# Altium schematic symbol library jlcpcb_2025_04_capacitors_extended_0603.schlib: 3668 symbols (part 10 of 20)
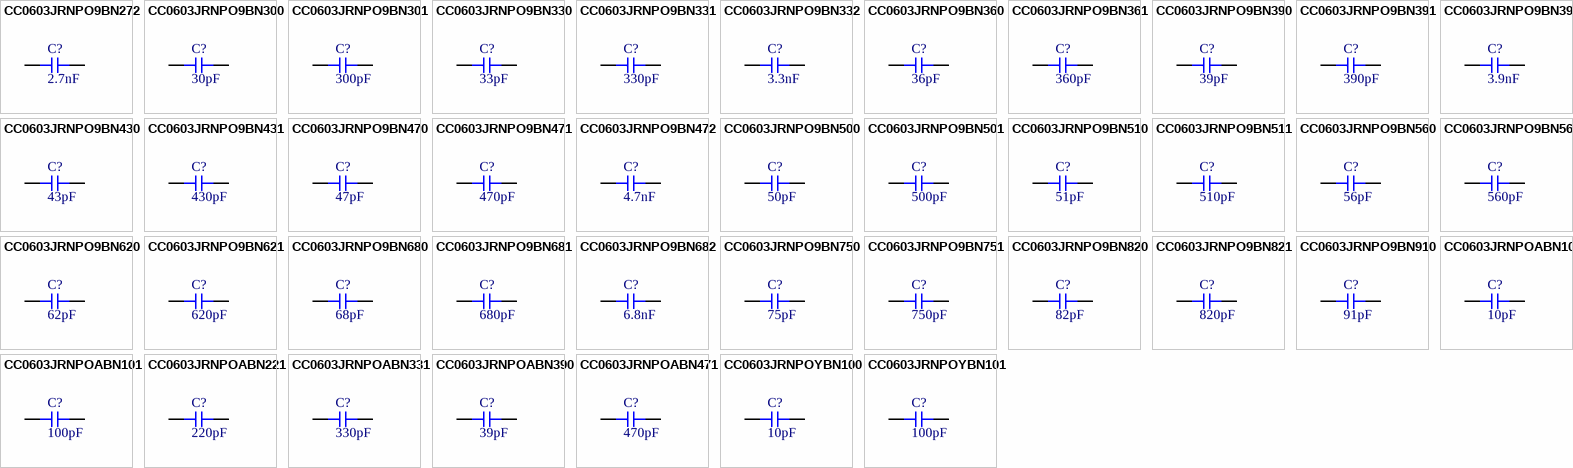
[diagram p100: symbols CC0603JRNPO9BN272 to CC0603JRNPOYBN101]

## CC0603JRNPOABN221
designator C?  Capacitance: 220pF  (hidden comment: *)
Capacitor, Ceramic (MLCC), 220pF, ±5%, 200V, NP0, ±5%, SMD 0603; Manufacturer: YAGEO; Manufacturer Part Number: CC0603JRNPOABN221; Package Size: 0603; JLCPCB Basic Part: No; JLCPCB Part Number: C576822; Supplier 1: LCSC; Category: Capacitors - MLCC; Supplier Part Number 1: C576822; Tolerance: ±5%; Voltage Rating: 200V; Temperature Coefficient: NP0; RoHS: Yes; ComponentLink1Description: Datasheet; ComponentLink1URL: https://wmsc.lcsc.com/wmsc/upload/file/pdf/v2/lcsc/2311211121_YAGEO-CC0603JRNPOABN221_C576822.pdf; ComponentLink2Description: JLCPCB Part URL; ComponentLink2URL: https://jlcpcb.com/partdetail/C576822; ComponentLink3Description: LCSC Part URL; ComponentLink3URL: https://lcsc.com/product-detail/Multilayer-Ceramic-Capacitors-MLCC---SMD-SMT_YAGEO-YAGEO-CC0603JRNPOABN221_C576822.html
footprint CAP-0603 (0603 (1608M) Capacitor)
pins: 1, 2

## CC0603JRNPOABN331
designator C?  Capacitance: 330pF  (hidden comment: *)
Capacitor, Ceramic (MLCC), 330pF, ±5%, 200V, NP0, ±5%, SMD 0603; Manufacturer: YAGEO; Manufacturer Part Number: CC0603JRNPOABN331; Package Size: 0603; JLCPCB Basic Part: No; JLCPCB Part Number: C576823; Supplier 1: LCSC; Category: Capacitors - MLCC; Supplier Part Number 1: C576823; Tolerance: ±5%; Voltage Rating: 200V; Temperature Coefficient: NP0; RoHS: Yes; ComponentLink1Description: Datasheet; ComponentLink1URL: https://wmsc.lcsc.com/wmsc/upload/file/pdf/v2/lcsc/2311211121_YAGEO-CC0603JRNPOABN331_C576823.pdf; ComponentLink2Description: JLCPCB Part URL; ComponentLink2URL: https://jlcpcb.com/partdetail/C576823; ComponentLink3Description: LCSC Part URL; ComponentLink3URL: https://lcsc.com/product-detail/Multilayer-Ceramic-Capacitors-MLCC---SMD-SMT_YAGEO-YAGEO-CC0603JRNPOABN331_C576823.html
footprint CAP-0603 (0603 (1608M) Capacitor)
pins: 1, 2

## CC0603JRNPOABN390
designator C?  Capacitance: 39pF  (hidden comment: *)
Capacitor, Ceramic (MLCC), 39pF, ±5%, 200V, NP0, ±5%, SMD 0603; Manufacturer: YAGEO; Manufacturer Part Number: CC0603JRNPOABN390; Package Size: 0603; JLCPCB Basic Part: No; JLCPCB Part Number: C2193767; Supplier 1: LCSC; Category: Capacitors - MLCC; Supplier Part Number 1: C2193767; Tolerance: ±5%; Voltage Rating: 200V; Temperature Coefficient: NP0; RoHS: Yes; ComponentLink1Description: Datasheet; ComponentLink1URL: https://wmsc.lcsc.com/wmsc/upload/file/pdf/v2/lcsc/2304140030_YAGEO-CC0603JRNPOABN390_C2193767.pdf; ComponentLink2Description: JLCPCB Part URL; ComponentLink2URL: https://jlcpcb.com/partdetail/C2193767; ComponentLink3Description: LCSC Part URL; ComponentLink3URL: https://lcsc.com/product-detail/Multilayer-Ceramic-Capacitors-MLCC---SMD-SMT_YAGEO-YAGEO-CC0603JRNPOABN390_C2193767.html
footprint CAP-0603 (0603 (1608M) Capacitor)
pins: 1, 2

## CC0603JRNPOABN471
designator C?  Capacitance: 470pF  (hidden comment: *)
Capacitor, Ceramic (MLCC), 470pF, ±5%, 200V, NP0, ±5%, SMD 0603; Manufacturer: YAGEO; Manufacturer Part Number: CC0603JRNPOABN471; Package Size: 0603; JLCPCB Basic Part: No; JLCPCB Part Number: C527068; Supplier 1: LCSC; Category: Capacitors - MLCC; Supplier Part Number 1: C527068; Tolerance: ±5%; Voltage Rating: 200V; Temperature Coefficient: NP0; RoHS: Yes; ComponentLink1Description: Datasheet; ComponentLink1URL: https://wmsc.lcsc.com/wmsc/upload/file/pdf/v2/lcsc/2007021836_YAGEO-CC0603JRNPOABN471_C527068.pdf; ComponentLink2Description: JLCPCB Part URL; ComponentLink2URL: https://jlcpcb.com/partdetail/C527068; ComponentLink3Description: LCSC Part URL; ComponentLink3URL: https://lcsc.com/product-detail/Multilayer-Ceramic-Capacitors-MLCC---SMD-SMT_YAGEO-YAGEO-CC0603JRNPOABN471_C527068.html
footprint CAP-0603 (0603 (1608M) Capacitor)
pins: 1, 2

## CC0603JRNPOYBN100
designator C?  Capacitance: 10pF  (hidden comment: *)
Capacitor, Ceramic (MLCC), 10pF, ±5%, 250V, NP0, ±5%, SMD 0603; Manufacturer: YAGEO; Manufacturer Part Number: CC0603JRNPOYBN100; Package Size: 0603; JLCPCB Basic Part: No; JLCPCB Part Number: C726617; Supplier 1: LCSC; Category: Capacitors - MLCC; Supplier Part Number 1: C726617; Tolerance: ±5%; Voltage Rating: 250V; Temperature Coefficient: NP0; RoHS: Yes; ComponentLink1Description: Datasheet; ComponentLink1URL: https://wmsc.lcsc.com/wmsc/upload/file/pdf/v2/lcsc/2009181007_YAGEO-CC0603JRNPOYBN100_C726617.pdf; ComponentLink2Description: JLCPCB Part URL; ComponentLink2URL: https://jlcpcb.com/partdetail/C726617; ComponentLink3Description: LCSC Part URL; ComponentLink3URL: https://lcsc.com/product-detail/Multilayer-Ceramic-Capacitors-MLCC---SMD-SMT_YAGEO-YAGEO-CC0603JRNPOYBN100_C726617.html
footprint CAP-0603 (0603 (1608M) Capacitor)
pins: 1, 2

## CC0603JRNPOYBN101
designator C?  Capacitance: 100pF  (hidden comment: *)
Capacitor, Ceramic (MLCC), 100pF, ±5%, 250V, NP0, ±5%, SMD 0603; Manufacturer: YAGEO; Manufacturer Part Number: CC0603JRNPOYBN101; Package Size: 0603; JLCPCB Basic Part: No; JLCPCB Part Number: C113799; Supplier 1: LCSC; Category: Capacitors - MLCC; Supplier Part Number 1: C113799; Tolerance: ±5%; Voltage Rating: 250V; Temperature Coefficient: NP0; RoHS: Yes; ComponentLink1Description: Datasheet; ComponentLink1URL: https://wmsc.lcsc.com/wmsc/upload/file/pdf/v2/lcsc/2304140030_YAGEO-CC0603JRNPOYBN101_C113799.pdf; ComponentLink2Description: JLCPCB Part URL; ComponentLink2URL: https://jlcpcb.com/partdetail/C113799; ComponentLink3Description: LCSC Part URL; ComponentLink3URL: https://lcsc.com/product-detail/Multilayer-Ceramic-Capacitors-MLCC---SMD-SMT_YAGEO-YAGEO-CC0603JRNPOYBN101_C113799.html
footprint CAP-0603 (0603 (1608M) Capacitor)
pins: 1, 2

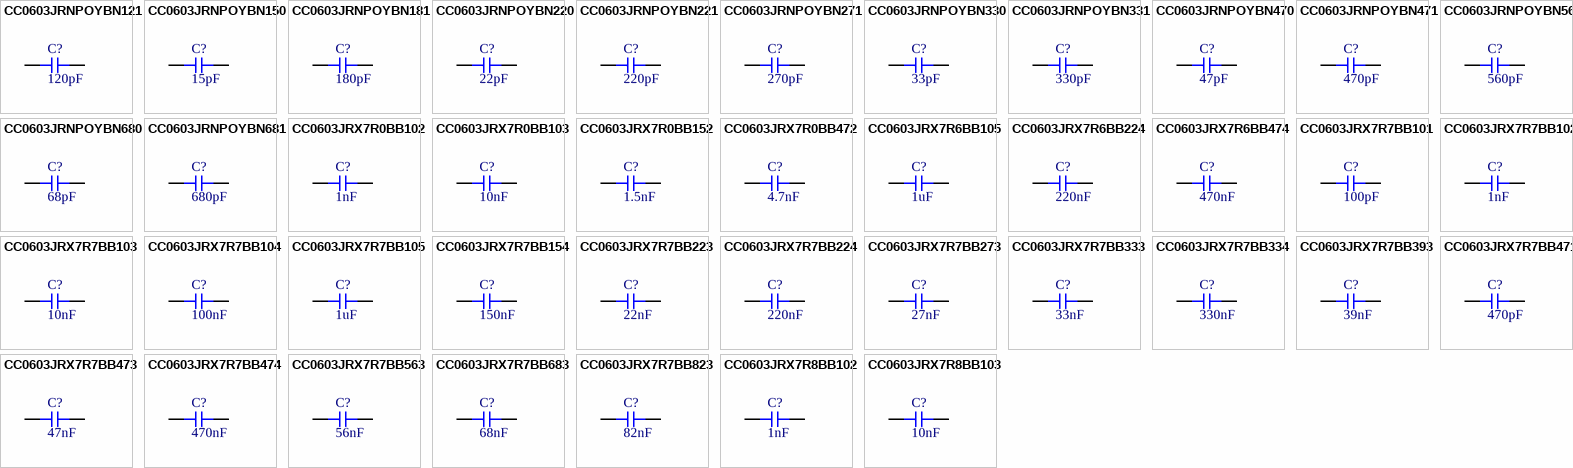
[diagram p42: symbols CC0603JRNPOYBN121 to CC0603JRX7R8BB103]

## CC0603JRNPOYBN121
designator C?  Capacitance: 120pF  (hidden comment: *)
Capacitor, Ceramic (MLCC), 120pF, ±5%, 250V, C0G, ±5%, SMD 0603; Manufacturer: YAGEO; Manufacturer Part Number: CC0603JRNPOYBN121; Package Size: 0603; JLCPCB Basic Part: No; JLCPCB Part Number: C3852667; Supplier 1: LCSC; Category: Capacitors - MLCC; Supplier Part Number 1: C3852667; Tolerance: ±5%; Voltage Rating: 250V; Temperature Coefficient: C0G; RoHS: Yes; ComponentLink1Description: Datasheet; ComponentLink1URL: https://wmsc.lcsc.com/wmsc/upload/file/pdf/v2/lcsc/2310251451_YAGEO-CC0603JRNPOYBN121_C3852667.pdf; ComponentLink2Description: JLCPCB Part URL; ComponentLink2URL: https://jlcpcb.com/partdetail/C3852667; ComponentLink3Description: LCSC Part URL; ComponentLink3URL: https://lcsc.com/product-detail/Multilayer-Ceramic-Capacitors-MLCC---SMD-SMT_YAGEO-YAGEO-CC0603JRNPOYBN121_C3852667.html
footprint CAP-0603 (0603 (1608M) Capacitor)
pins: 1, 2

## CC0603JRNPOYBN150
designator C?  Capacitance: 15pF  (hidden comment: *)
Capacitor, Ceramic (MLCC), 15pF, ±5%, 250V, NP0, ±5%, SMD 0603; Manufacturer: YAGEO; Manufacturer Part Number: CC0603JRNPOYBN150; Package Size: 0603; JLCPCB Basic Part: No; JLCPCB Part Number: C113800; Supplier 1: LCSC; Category: Capacitors - MLCC; Supplier Part Number 1: C113800; Tolerance: ±5%; Voltage Rating: 250V; Temperature Coefficient: NP0; RoHS: Yes; ComponentLink1Description: Datasheet; ComponentLink1URL: https://wmsc.lcsc.com/wmsc/upload/file/pdf/v2/lcsc/2304140030_YAGEO-CC0603JRNPOYBN150_C113800.pdf; ComponentLink2Description: JLCPCB Part URL; ComponentLink2URL: https://jlcpcb.com/partdetail/C113800; ComponentLink3Description: LCSC Part URL; ComponentLink3URL: https://lcsc.com/product-detail/Multilayer-Ceramic-Capacitors-MLCC---SMD-SMT_YAGEO-YAGEO-CC0603JRNPOYBN150_C113800.html
footprint CAP-0603 (0603 (1608M) Capacitor)
pins: 1, 2

## CC0603JRNPOYBN181
designator C?  Capacitance: 180pF  (hidden comment: *)
Capacitor, Ceramic (MLCC), 180pF, ±5%, 250V, NP0, ±5%, SMD 0603; Manufacturer: YAGEO; Manufacturer Part Number: CC0603JRNPOYBN181; Package Size: 0603; JLCPCB Basic Part: No; JLCPCB Part Number: C576826; Supplier 1: LCSC; Category: Capacitors - MLCC; Supplier Part Number 1: C576826; Tolerance: ±5%; Voltage Rating: 250V; Temperature Coefficient: NP0; RoHS: Yes; ComponentLink1Description: Datasheet; ComponentLink1URL: https://wmsc.lcsc.com/wmsc/upload/file/pdf/v2/lcsc/2302221830_YAGEO-CC0603JRNPOYBN181_C576826.pdf; ComponentLink2Description: JLCPCB Part URL; ComponentLink2URL: https://jlcpcb.com/partdetail/C576826; ComponentLink3Description: LCSC Part URL; ComponentLink3URL: https://lcsc.com/product-detail/Multilayer-Ceramic-Capacitors-MLCC---SMD-SMT_YAGEO-YAGEO-CC0603JRNPOYBN181_C576826.html
footprint CAP-0603 (0603 (1608M) Capacitor)
pins: 1, 2

## CC0603JRNPOYBN220
designator C?  Capacitance: 22pF  (hidden comment: *)
Capacitor, Ceramic (MLCC), 22pF, ±5%, 250V, NP0, ±5%, SMD 0603; Manufacturer: YAGEO; Manufacturer Part Number: CC0603JRNPOYBN220; Package Size: 0603; JLCPCB Basic Part: No; JLCPCB Part Number: C1853755; Supplier 1: LCSC; Category: Capacitors - MLCC; Supplier Part Number 1: C1853755; Tolerance: ±5%; Voltage Rating: 250V; Temperature Coefficient: NP0; RoHS: Yes; ComponentLink1Description: Datasheet; ComponentLink1URL: https://wmsc.lcsc.com/wmsc/upload/file/pdf/v2/lcsc/2201271100_YAGEO-CC0603JRNPOYBN220_C1853755.pdf; ComponentLink2Description: JLCPCB Part URL; ComponentLink2URL: https://jlcpcb.com/partdetail/C1853755; ComponentLink3Description: LCSC Part URL; ComponentLink3URL: https://lcsc.com/product-detail/Multilayer-Ceramic-Capacitors-MLCC---SMD-SMT_YAGEO-YAGEO-CC0603JRNPOYBN220_C1853755.html
footprint CAP-0603 (0603 (1608M) Capacitor)
pins: 1, 2

## CC0603JRNPOYBN221
designator C?  Capacitance: 220pF  (hidden comment: *)
Capacitor, Ceramic (MLCC), 220pF, ±5%, 250V, NP0, ±5%, SMD 0603; Manufacturer: YAGEO; Manufacturer Part Number: CC0603JRNPOYBN221; Package Size: 0603; JLCPCB Basic Part: No; JLCPCB Part Number: C527069; Supplier 1: LCSC; Category: Capacitors - MLCC; Supplier Part Number 1: C527069; Tolerance: ±5%; Voltage Rating: 250V; Temperature Coefficient: NP0; RoHS: Yes; ComponentLink1Description: Datasheet; ComponentLink1URL: https://wmsc.lcsc.com/wmsc/upload/file/pdf/v2/lcsc/2006101835_YAGEO-CC0603JRNPOYBN221_C527069.pdf; ComponentLink2Description: JLCPCB Part URL; ComponentLink2URL: https://jlcpcb.com/partdetail/C527069; ComponentLink3Description: LCSC Part URL; ComponentLink3URL: https://lcsc.com/product-detail/Multilayer-Ceramic-Capacitors-MLCC---SMD-SMT_YAGEO-YAGEO-CC0603JRNPOYBN221_C527069.html
footprint CAP-0603 (0603 (1608M) Capacitor)
pins: 1, 2

## CC0603JRNPOYBN271
designator C?  Capacitance: 270pF  (hidden comment: *)
Capacitor, Ceramic (MLCC), 270pF, ±5%, 250V, NP0, ±5%, SMD 0603; Manufacturer: YAGEO; Manufacturer Part Number: CC0603JRNPOYBN271; Package Size: 0603; JLCPCB Basic Part: No; JLCPCB Part Number: C576827; Supplier 1: LCSC; Category: Capacitors - MLCC; Supplier Part Number 1: C576827; Tolerance: ±5%; Voltage Rating: 250V; Temperature Coefficient: NP0; RoHS: Yes; ComponentLink1Description: Datasheet; ComponentLink1URL: https://wmsc.lcsc.com/wmsc/upload/file/pdf/v2/lcsc/2212091030_YAGEO-CC0603JRNPOYBN271_C576827.pdf; ComponentLink2Description: JLCPCB Part URL; ComponentLink2URL: https://jlcpcb.com/partdetail/C576827; ComponentLink3Description: LCSC Part URL; ComponentLink3URL: https://lcsc.com/product-detail/Multilayer-Ceramic-Capacitors-MLCC---SMD-SMT_YAGEO-YAGEO-CC0603JRNPOYBN271_C576827.html
footprint CAP-0603 (0603 (1608M) Capacitor)
pins: 1, 2

## CC0603JRNPOYBN330
designator C?  Capacitance: 33pF  (hidden comment: *)
Capacitor, Ceramic (MLCC), 33pF, ±5%, 250V, NP0, ±5%, SMD 0603; Manufacturer: YAGEO; Manufacturer Part Number: CC0603JRNPOYBN330; Package Size: 0603; JLCPCB Basic Part: No; JLCPCB Part Number: C726618; Supplier 1: LCSC; Category: Capacitors - MLCC; Supplier Part Number 1: C726618; Tolerance: ±5%; Voltage Rating: 250V; Temperature Coefficient: NP0; RoHS: Yes; ComponentLink1Description: Datasheet; ComponentLink1URL: https://wmsc.lcsc.com/wmsc/upload/file/pdf/v2/lcsc/2212011400_YAGEO-CC0603JRNPOYBN330_C726618.pdf; ComponentLink2Description: JLCPCB Part URL; ComponentLink2URL: https://jlcpcb.com/partdetail/C726618; ComponentLink3Description: LCSC Part URL; ComponentLink3URL: https://lcsc.com/product-detail/Multilayer-Ceramic-Capacitors-MLCC---SMD-SMT_YAGEO-YAGEO-CC0603JRNPOYBN330_C726618.html
footprint CAP-0603 (0603 (1608M) Capacitor)
pins: 1, 2

## CC0603JRNPOYBN331
designator C?  Capacitance: 330pF  (hidden comment: *)
Capacitor, Ceramic (MLCC), 330pF, ±5%, 250V, NP0, ±5%, SMD 0603; Manufacturer: YAGEO; Manufacturer Part Number: CC0603JRNPOYBN331; Package Size: 0603; JLCPCB Basic Part: No; JLCPCB Part Number: C576828; Supplier 1: LCSC; Category: Capacitors - MLCC; Supplier Part Number 1: C576828; Tolerance: ±5%; Voltage Rating: 250V; Temperature Coefficient: NP0; RoHS: Yes; ComponentLink1Description: Datasheet; ComponentLink1URL: https://wmsc.lcsc.com/wmsc/upload/file/pdf/v2/lcsc/2304140030_YAGEO-CC0603JRNPOYBN331_C576828.pdf; ComponentLink2Description: JLCPCB Part URL; ComponentLink2URL: https://jlcpcb.com/partdetail/C576828; ComponentLink3Description: LCSC Part URL; ComponentLink3URL: https://lcsc.com/product-detail/Multilayer-Ceramic-Capacitors-MLCC---SMD-SMT_YAGEO-YAGEO-CC0603JRNPOYBN331_C576828.html
footprint CAP-0603 (0603 (1608M) Capacitor)
pins: 1, 2

## CC0603JRNPOYBN470
designator C?  Capacitance: 47pF  (hidden comment: *)
Capacitor, Ceramic (MLCC), 47pF, ±5%, 250V, NP0, ±5%, SMD 0603; Manufacturer: YAGEO; Manufacturer Part Number: CC0603JRNPOYBN470; Package Size: 0603; JLCPCB Basic Part: No; JLCPCB Part Number: C113801; Supplier 1: LCSC; Category: Capacitors - MLCC; Supplier Part Number 1: C113801; Tolerance: ±5%; Voltage Rating: 250V; Temperature Coefficient: NP0; RoHS: Yes; ComponentLink1Description: Datasheet; ComponentLink1URL: https://wmsc.lcsc.com/wmsc/upload/file/pdf/v2/lcsc/2304140030_YAGEO-CC0603JRNPOYBN470_C113801.pdf; ComponentLink2Description: JLCPCB Part URL; ComponentLink2URL: https://jlcpcb.com/partdetail/C113801; ComponentLink3Description: LCSC Part URL; ComponentLink3URL: https://lcsc.com/product-detail/Multilayer-Ceramic-Capacitors-MLCC---SMD-SMT_YAGEO-YAGEO-CC0603JRNPOYBN470_C113801.html
footprint CAP-0603 (0603 (1608M) Capacitor)
pins: 1, 2

## CC0603JRNPOYBN471
designator C?  Capacitance: 470pF  (hidden comment: *)
Capacitor, Ceramic (MLCC), 470pF, ±5%, 250V, NP0, ±5%, SMD 0603; Manufacturer: YAGEO; Manufacturer Part Number: CC0603JRNPOYBN471; Package Size: 0603; JLCPCB Basic Part: No; JLCPCB Part Number: C576829; Supplier 1: LCSC; Category: Capacitors - MLCC; Supplier Part Number 1: C576829; Tolerance: ±5%; Voltage Rating: 250V; Temperature Coefficient: NP0; RoHS: Yes; ComponentLink1Description: Datasheet; ComponentLink1URL: https://wmsc.lcsc.com/wmsc/upload/file/pdf/v2/lcsc/2204021130_YAGEO-CC0603JRNPOYBN471_C576829.pdf; ComponentLink2Description: JLCPCB Part URL; ComponentLink2URL: https://jlcpcb.com/partdetail/C576829; ComponentLink3Description: LCSC Part URL; ComponentLink3URL: https://lcsc.com/product-detail/Multilayer-Ceramic-Capacitors-MLCC---SMD-SMT_YAGEO-YAGEO-CC0603JRNPOYBN471_C576829.html
footprint CAP-0603 (0603 (1608M) Capacitor)
pins: 1, 2

## CC0603JRNPOYBN561
designator C?  Capacitance: 560pF  (hidden comment: *)
Capacitor, Ceramic (MLCC), 560pF, ±5%, 250V, C0G, ±5%, SMD 0603; Manufacturer: YAGEO; Manufacturer Part Number: CC0603JRNPOYBN561; Package Size: 0603; JLCPCB Basic Part: No; JLCPCB Part Number: C3840011; Supplier 1: LCSC; Category: Capacitors - MLCC; Supplier Part Number 1: C3840011; Tolerance: ±5%; Voltage Rating: 250V; Temperature Coefficient: C0G; RoHS: Yes; ComponentLink1Description: Datasheet; ComponentLink1URL: https://wmsc.lcsc.com/wmsc/upload/file/pdf/v2/lcsc/2311211121_YAGEO-CC0603JRNPOYBN561_C3840011.pdf; ComponentLink2Description: JLCPCB Part URL; ComponentLink2URL: https://jlcpcb.com/partdetail/C3840011; ComponentLink3Description: LCSC Part URL; ComponentLink3URL: https://lcsc.com/product-detail/Multilayer-Ceramic-Capacitors-MLCC---SMD-SMT_YAGEO-YAGEO-CC0603JRNPOYBN561_C3840011.html
footprint CAP-0603 (0603 (1608M) Capacitor)
pins: 1, 2

## CC0603JRNPOYBN680
designator C?  Capacitance: 68pF  (hidden comment: *)
Capacitor, Ceramic (MLCC), 68pF, ±5%, 250V, NP0, ±5%, SMD 0603; Manufacturer: YAGEO; Manufacturer Part Number: CC0603JRNPOYBN680; Package Size: 0603; JLCPCB Basic Part: No; JLCPCB Part Number: C1853752; Supplier 1: LCSC; Category: Capacitors - MLCC; Supplier Part Number 1: C1853752; Tolerance: ±5%; Voltage Rating: 250V; Temperature Coefficient: NP0; RoHS: Yes; ComponentLink1Description: Datasheet; ComponentLink1URL: https://wmsc.lcsc.com/wmsc/upload/file/pdf/v2/lcsc/2201271100_YAGEO-CC0603JRNPOYBN680_C1853752.pdf; ComponentLink2Description: JLCPCB Part URL; ComponentLink2URL: https://jlcpcb.com/partdetail/C1853752; ComponentLink3Description: LCSC Part URL; ComponentLink3URL: https://lcsc.com/product-detail/Multilayer-Ceramic-Capacitors-MLCC---SMD-SMT_YAGEO-YAGEO-CC0603JRNPOYBN680_C1853752.html
footprint CAP-0603 (0603 (1608M) Capacitor)
pins: 1, 2

## CC0603JRNPOYBN681
designator C?  Capacitance: 680pF  (hidden comment: *)
Capacitor, Ceramic (MLCC), 680pF, ±5%, 250V, NP0, ±5%, SMD 0603; Manufacturer: YAGEO; Manufacturer Part Number: CC0603JRNPOYBN681; Package Size: 0603; JLCPCB Basic Part: No; JLCPCB Part Number: C576830; Supplier 1: LCSC; Category: Capacitors - MLCC; Supplier Part Number 1: C576830; Tolerance: ±5%; Voltage Rating: 250V; Temperature Coefficient: NP0; RoHS: Yes; ComponentLink1Description: Datasheet; ComponentLink1URL: https://wmsc.lcsc.com/wmsc/upload/file/pdf/v2/lcsc/2204021130_YAGEO-CC0603JRNPOYBN681_C576830.pdf; ComponentLink2Description: JLCPCB Part URL; ComponentLink2URL: https://jlcpcb.com/partdetail/C576830; ComponentLink3Description: LCSC Part URL; ComponentLink3URL: https://lcsc.com/product-detail/Multilayer-Ceramic-Capacitors-MLCC---SMD-SMT_YAGEO-YAGEO-CC0603JRNPOYBN681_C576830.html
footprint CAP-0603 (0603 (1608M) Capacitor)
pins: 1, 2

## CC0603JRX7R0BB102
designator C?  Capacitance: 1nF  (hidden comment: *)
Capacitor, Ceramic (MLCC), 1nF, ±5%, 100V, X7R, ±5%, SMD 0603; Manufacturer: YAGEO; Manufacturer Part Number: CC0603JRX7R0BB102; Package Size: 0603; JLCPCB Basic Part: No; JLCPCB Part Number: C576832; Supplier 1: LCSC; Category: Capacitors - MLCC; Supplier Part Number 1: C576832; Tolerance: ±5%; Voltage Rating: 100V; Temperature Coefficient: X7R; RoHS: Yes; ComponentLink1Description: Datasheet; ComponentLink1URL: https://wmsc.lcsc.com/wmsc/upload/file/pdf/v2/lcsc/2209081200_YAGEO-CC0603JRX7R0BB102_C576832.pdf; ComponentLink2Description: JLCPCB Part URL; ComponentLink2URL: https://jlcpcb.com/partdetail/C576832; ComponentLink3Description: LCSC Part URL; ComponentLink3URL: https://lcsc.com/product-detail/Multilayer-Ceramic-Capacitors-MLCC---SMD-SMT_YAGEO-YAGEO-CC0603JRX7R0BB102_C576832.html
footprint CAP-0603 (0603 (1608M) Capacitor)
pins: 1, 2

## CC0603JRX7R0BB103
designator C?  Capacitance: 10nF  (hidden comment: *)
Capacitor, Ceramic (MLCC), 10nF, ±5%, 100V, X7R, ±5%, SMD 0603; Manufacturer: YAGEO; Manufacturer Part Number: CC0603JRX7R0BB103; Package Size: 0603; JLCPCB Basic Part: No; JLCPCB Part Number: C576833; Supplier 1: LCSC; Category: Capacitors - MLCC; Supplier Part Number 1: C576833; Tolerance: ±5%; Voltage Rating: 100V; Temperature Coefficient: X7R; RoHS: Yes; ComponentLink1Description: Datasheet; ComponentLink1URL: https://wmsc.lcsc.com/wmsc/upload/file/pdf/v2/lcsc/2204021130_YAGEO-CC0603JRX7R0BB103_C576833.pdf; ComponentLink2Description: JLCPCB Part URL; ComponentLink2URL: https://jlcpcb.com/partdetail/C576833; ComponentLink3Description: LCSC Part URL; ComponentLink3URL: https://lcsc.com/product-detail/Multilayer-Ceramic-Capacitors-MLCC---SMD-SMT_YAGEO-YAGEO-CC0603JRX7R0BB103_C576833.html
footprint CAP-0603 (0603 (1608M) Capacitor)
pins: 1, 2

## CC0603JRX7R0BB152
designator C?  Capacitance: 1.5nF  (hidden comment: *)
Capacitor, Ceramic (MLCC), 1.5nF, ±5%, 100V, X7R, ±5%, SMD 0603; Manufacturer: YAGEO; Manufacturer Part Number: CC0603JRX7R0BB152; Package Size: 0603; JLCPCB Basic Part: No; JLCPCB Part Number: C527070; Supplier 1: LCSC; Category: Capacitors - MLCC; Supplier Part Number 1: C527070; Tolerance: ±5%; Voltage Rating: 100V; Temperature Coefficient: X7R; RoHS: Yes; ComponentLink1Description: Datasheet; ComponentLink1URL: https://wmsc.lcsc.com/wmsc/upload/file/pdf/v2/lcsc/2008201233_YAGEO-CC0603JRX7R0BB152_C527070.pdf; ComponentLink2Description: JLCPCB Part URL; ComponentLink2URL: https://jlcpcb.com/partdetail/C527070; ComponentLink3Description: LCSC Part URL; ComponentLink3URL: https://lcsc.com/product-detail/Multilayer-Ceramic-Capacitors-MLCC---SMD-SMT_YAGEO-YAGEO-CC0603JRX7R0BB152_C527070.html
footprint CAP-0603 (0603 (1608M) Capacitor)
pins: 1, 2

## CC0603JRX7R0BB472
designator C?  Capacitance: 4.7nF  (hidden comment: *)
Capacitor, Ceramic (MLCC), 4.7nF, ±5%, 100V, X7R, ±5%, SMD 0603; Manufacturer: YAGEO; Manufacturer Part Number: CC0603JRX7R0BB472; Package Size: 0603; JLCPCB Basic Part: No; JLCPCB Part Number: C576834; Supplier 1: LCSC; Category: Capacitors - MLCC; Supplier Part Number 1: C576834; Tolerance: ±5%; Voltage Rating: 100V; Temperature Coefficient: X7R; RoHS: Yes; ComponentLink1Description: Datasheet; ComponentLink1URL: https://wmsc.lcsc.com/wmsc/upload/file/pdf/v2/lcsc/2201131030_YAGEO-CC0603JRX7R0BB472_C576834.pdf; ComponentLink2Description: JLCPCB Part URL; ComponentLink2URL: https://jlcpcb.com/partdetail/C576834; ComponentLink3Description: LCSC Part URL; ComponentLink3URL: https://lcsc.com/product-detail/Multilayer-Ceramic-Capacitors-MLCC---SMD-SMT_YAGEO-YAGEO-CC0603JRX7R0BB472_C576834.html
footprint CAP-0603 (0603 (1608M) Capacitor)
pins: 1, 2

## CC0603JRX7R6BB105
designator C?  Capacitance: 1uF  (hidden comment: *)
Capacitor, Ceramic (MLCC), 1uF, ±5%, 10V, X7R, ±5%, SMD 0603; Manufacturer: YAGEO; Manufacturer Part Number: CC0603JRX7R6BB105; Package Size: 0603; JLCPCB Basic Part: No; JLCPCB Part Number: C519559; Supplier 1: LCSC; Category: Capacitors - MLCC; Supplier Part Number 1: C519559; Tolerance: ±5%; Voltage Rating: 10V; Temperature Coefficient: X7R; RoHS: Yes; ComponentLink1Description: Datasheet; ComponentLink1URL: https://wmsc.lcsc.com/wmsc/upload/file/pdf/v2/lcsc/2007231533_YAGEO-CC0603JRX7R6BB105_C519559.pdf; ComponentLink2Description: JLCPCB Part URL; ComponentLink2URL: https://jlcpcb.com/partdetail/C519559; ComponentLink3Description: LCSC Part URL; ComponentLink3URL: https://lcsc.com/product-detail/Multilayer-Ceramic-Capacitors-MLCC---SMD-SMT_YAGEO-YAGEO-CC0603JRX7R6BB105_C519559.html
footprint CAP-0603 (0603 (1608M) Capacitor)
pins: 1, 2

## CC0603JRX7R6BB224
designator C?  Capacitance: 220nF  (hidden comment: *)
Capacitor, Ceramic (MLCC), 220nF, ±5%, 10V, X7R, ±5%, SMD 0603; Manufacturer: YAGEO; Manufacturer Part Number: CC0603JRX7R6BB224; Package Size: 0603; JLCPCB Basic Part: No; JLCPCB Part Number: C519555; Supplier 1: LCSC; Category: Capacitors - MLCC; Supplier Part Number 1: C519555; Tolerance: ±5%; Voltage Rating: 10V; Temperature Coefficient: X7R; RoHS: Yes; ComponentLink1Description: Datasheet; ComponentLink1URL: https://wmsc.lcsc.com/wmsc/upload/file/pdf/v2/lcsc/2008051835_YAGEO-CC0603JRX7R6BB224_C519555.pdf; ComponentLink2Description: JLCPCB Part URL; ComponentLink2URL: https://jlcpcb.com/partdetail/C519555; ComponentLink3Description: LCSC Part URL; ComponentLink3URL: https://lcsc.com/product-detail/Multilayer-Ceramic-Capacitors-MLCC---SMD-SMT_YAGEO-YAGEO-CC0603JRX7R6BB224_C519555.html
footprint CAP-0603 (0603 (1608M) Capacitor)
pins: 1, 2

## CC0603JRX7R6BB474
designator C?  Capacitance: 470nF  (hidden comment: *)
Capacitor, Ceramic (MLCC), 470nF, ±5%, 10V, X7R, ±5%, SMD 0603; Manufacturer: YAGEO; Manufacturer Part Number: CC0603JRX7R6BB474; Package Size: 0603; JLCPCB Basic Part: No; JLCPCB Part Number: C519557; Supplier 1: LCSC; Category: Capacitors - MLCC; Supplier Part Number 1: C519557; Tolerance: ±5%; Voltage Rating: 10V; Temperature Coefficient: X7R; RoHS: Yes; ComponentLink1Description: Datasheet; ComponentLink1URL: https://wmsc.lcsc.com/wmsc/upload/file/pdf/v2/lcsc/2006011835_YAGEO-CC0603JRX7R6BB474_C519557.pdf; ComponentLink2Description: JLCPCB Part URL; ComponentLink2URL: https://jlcpcb.com/partdetail/C519557; ComponentLink3Description: LCSC Part URL; ComponentLink3URL: https://lcsc.com/product-detail/Multilayer-Ceramic-Capacitors-MLCC---SMD-SMT_YAGEO-YAGEO-CC0603JRX7R6BB474_C519557.html
footprint CAP-0603 (0603 (1608M) Capacitor)
pins: 1, 2

## CC0603JRX7R7BB101
designator C?  Capacitance: 100pF  (hidden comment: *)
Capacitor, Ceramic (MLCC), 100pF, ±5%, 16V, X7R, ±5%, SMD 0603; Manufacturer: YAGEO; Manufacturer Part Number: CC0603JRX7R7BB101; Package Size: 0603; JLCPCB Basic Part: No; JLCPCB Part Number: C519511; Supplier 1: LCSC; Category: Capacitors - MLCC; Supplier Part Number 1: C519511; Tolerance: ±5%; Voltage Rating: 16V; Temperature Coefficient: X7R; RoHS: Yes; ComponentLink1Description: Datasheet; ComponentLink1URL: https://wmsc.lcsc.com/wmsc/upload/file/pdf/v2/lcsc/2008031233_YAGEO-CC0603JRX7R7BB101_C519511.pdf; ComponentLink2Description: JLCPCB Part URL; ComponentLink2URL: https://jlcpcb.com/partdetail/C519511; ComponentLink3Description: LCSC Part URL; ComponentLink3URL: https://lcsc.com/product-detail/Multilayer-Ceramic-Capacitors-MLCC---SMD-SMT_YAGEO-YAGEO-CC0603JRX7R7BB101_C519511.html
footprint CAP-0603 (0603 (1608M) Capacitor)
pins: 1, 2

## CC0603JRX7R7BB102
designator C?  Capacitance: 1nF  (hidden comment: *)
Capacitor, Ceramic (MLCC), 1nF, ±5%, 16V, X7R, ±5%, SMD 0603; Manufacturer: YAGEO; Manufacturer Part Number: CC0603JRX7R7BB102; Package Size: 0603; JLCPCB Basic Part: No; JLCPCB Part Number: C519507; Supplier 1: LCSC; Category: Capacitors - MLCC; Supplier Part Number 1: C519507; Tolerance: ±5%; Voltage Rating: 16V; Temperature Coefficient: X7R; RoHS: Yes; ComponentLink1Description: Datasheet; ComponentLink1URL: https://wmsc.lcsc.com/wmsc/upload/file/pdf/v2/lcsc/2005181835_YAGEO-CC0603JRX7R7BB102_C519507.pdf; ComponentLink2Description: JLCPCB Part URL; ComponentLink2URL: https://jlcpcb.com/partdetail/C519507; ComponentLink3Description: LCSC Part URL; ComponentLink3URL: https://lcsc.com/product-detail/Multilayer-Ceramic-Capacitors-MLCC---SMD-SMT_YAGEO-YAGEO-CC0603JRX7R7BB102_C519507.html
footprint CAP-0603 (0603 (1608M) Capacitor)
pins: 1, 2

## CC0603JRX7R7BB103
designator C?  Capacitance: 10nF  (hidden comment: *)
Capacitor, Ceramic (MLCC), 10nF, ±5%, 16V, X7R, ±5%, SMD 0603; Manufacturer: YAGEO; Manufacturer Part Number: CC0603JRX7R7BB103; Package Size: 0603; JLCPCB Basic Part: No; JLCPCB Part Number: C519509; Supplier 1: LCSC; Category: Capacitors - MLCC; Supplier Part Number 1: C519509; Tolerance: ±5%; Voltage Rating: 16V; Temperature Coefficient: X7R; RoHS: Yes; ComponentLink1Description: Datasheet; ComponentLink1URL: https://wmsc.lcsc.com/wmsc/upload/file/pdf/v2/lcsc/2005181835_YAGEO-CC0603JRX7R7BB103_C519509.pdf; ComponentLink2Description: JLCPCB Part URL; ComponentLink2URL: https://jlcpcb.com/partdetail/C519509; ComponentLink3Description: LCSC Part URL; ComponentLink3URL: https://lcsc.com/product-detail/Multilayer-Ceramic-Capacitors-MLCC---SMD-SMT_YAGEO-YAGEO-CC0603JRX7R7BB103_C519509.html
footprint CAP-0603 (0603 (1608M) Capacitor)
pins: 1, 2

## CC0603JRX7R7BB104
designator C?  Capacitance: 100nF  (hidden comment: *)
Capacitor, Ceramic (MLCC), 100nF, ±5%, 16V, X7R, ±5%, SMD 0603; Manufacturer: YAGEO; Manufacturer Part Number: CC0603JRX7R7BB104; Package Size: 0603; JLCPCB Basic Part: No; JLCPCB Part Number: C109474; Supplier 1: LCSC; Category: Capacitors - MLCC; Supplier Part Number 1: C109474; Tolerance: ±5%; Voltage Rating: 16V; Temperature Coefficient: X7R; RoHS: Yes; ComponentLink1Description: Datasheet; ComponentLink1URL: https://wmsc.lcsc.com/wmsc/upload/file/pdf/v2/lcsc/2304140030_YAGEO-CC0603JRX7R7BB104_C109474.pdf; ComponentLink2Description: JLCPCB Part URL; ComponentLink2URL: https://jlcpcb.com/partdetail/C109474; ComponentLink3Description: LCSC Part URL; ComponentLink3URL: https://lcsc.com/product-detail/Multilayer-Ceramic-Capacitors-MLCC---SMD-SMT_YAGEO-YAGEO-CC0603JRX7R7BB104_C109474.html
footprint CAP-0603 (0603 (1608M) Capacitor)
pins: 1, 2

## CC0603JRX7R7BB105
designator C?  Capacitance: 1uF  (hidden comment: *)
Capacitor, Ceramic (MLCC), 1uF, ±5%, 16V, X7R, ±5%, SMD 0603; Manufacturer: YAGEO; Manufacturer Part Number: CC0603JRX7R7BB105; Package Size: 0603; JLCPCB Basic Part: No; JLCPCB Part Number: C519560; Supplier 1: LCSC; Category: Capacitors - MLCC; Supplier Part Number 1: C519560; Tolerance: ±5%; Voltage Rating: 16V; Temperature Coefficient: X7R; RoHS: Yes; ComponentLink1Description: Datasheet; ComponentLink1URL: https://wmsc.lcsc.com/wmsc/upload/file/pdf/v2/lcsc/2005181835_YAGEO-CC0603JRX7R7BB105_C519560.pdf; ComponentLink2Description: JLCPCB Part URL; ComponentLink2URL: https://jlcpcb.com/partdetail/C519560; ComponentLink3Description: LCSC Part URL; ComponentLink3URL: https://lcsc.com/product-detail/Multilayer-Ceramic-Capacitors-MLCC---SMD-SMT_YAGEO-YAGEO-CC0603JRX7R7BB105_C519560.html
footprint CAP-0603 (0603 (1608M) Capacitor)
pins: 1, 2

## CC0603JRX7R7BB154
designator C?  Capacitance: 150nF  (hidden comment: *)
Capacitor, Ceramic (MLCC), 150nF, ±5%, 16V, X7R, ±5%, SMD 0603; Manufacturer: YAGEO; Manufacturer Part Number: CC0603JRX7R7BB154; Package Size: 0603; JLCPCB Basic Part: No; JLCPCB Part Number: C519577; Supplier 1: LCSC; Category: Capacitors - MLCC; Supplier Part Number 1: C519577; Tolerance: ±5%; Voltage Rating: 16V; Temperature Coefficient: X7R; RoHS: Yes; ComponentLink1Description: Datasheet; ComponentLink1URL: https://wmsc.lcsc.com/wmsc/upload/file/pdf/v2/lcsc/2010251434_YAGEO-CC0603JRX7R7BB154_C519577.pdf; ComponentLink2Description: JLCPCB Part URL; ComponentLink2URL: https://jlcpcb.com/partdetail/C519577; ComponentLink3Description: LCSC Part URL; ComponentLink3URL: https://lcsc.com/product-detail/Multilayer-Ceramic-Capacitors-MLCC---SMD-SMT_YAGEO-YAGEO-CC0603JRX7R7BB154_C519577.html
footprint CAP-0603 (0603 (1608M) Capacitor)
pins: 1, 2

## CC0603JRX7R7BB223
designator C?  Capacitance: 22nF  (hidden comment: *)
Capacitor, Ceramic (MLCC), 22nF, ±5%, 16V, X7R, ±5%, SMD 0603; Manufacturer: YAGEO; Manufacturer Part Number: CC0603JRX7R7BB223; Package Size: 0603; JLCPCB Basic Part: No; JLCPCB Part Number: C519532; Supplier 1: LCSC; Category: Capacitors - MLCC; Supplier Part Number 1: C519532; Tolerance: ±5%; Voltage Rating: 16V; Temperature Coefficient: X7R; RoHS: Yes; ComponentLink1Description: Datasheet; ComponentLink1URL: https://wmsc.lcsc.com/wmsc/upload/file/pdf/v2/lcsc/2006011835_YAGEO-CC0603JRX7R7BB223_C519532.pdf; ComponentLink2Description: JLCPCB Part URL; ComponentLink2URL: https://jlcpcb.com/partdetail/C519532; ComponentLink3Description: LCSC Part URL; ComponentLink3URL: https://lcsc.com/product-detail/Multilayer-Ceramic-Capacitors-MLCC---SMD-SMT_YAGEO-YAGEO-CC0603JRX7R7BB223_C519532.html
footprint CAP-0603 (0603 (1608M) Capacitor)
pins: 1, 2

## CC0603JRX7R7BB224
designator C?  Capacitance: 220nF  (hidden comment: *)
Capacitor, Ceramic (MLCC), 220nF, ±5%, 16V, X7R, ±5%, SMD 0603; Manufacturer: YAGEO; Manufacturer Part Number: CC0603JRX7R7BB224; Package Size: 0603; JLCPCB Basic Part: No; JLCPCB Part Number: C519556; Supplier 1: LCSC; Category: Capacitors - MLCC; Supplier Part Number 1: C519556; Tolerance: ±5%; Voltage Rating: 16V; Temperature Coefficient: X7R; RoHS: Yes; ComponentLink1Description: Datasheet; ComponentLink1URL: https://wmsc.lcsc.com/wmsc/upload/file/pdf/v2/lcsc/2006011835_YAGEO-CC0603JRX7R7BB224_C519556.pdf; ComponentLink2Description: JLCPCB Part URL; ComponentLink2URL: https://jlcpcb.com/partdetail/C519556; ComponentLink3Description: LCSC Part URL; ComponentLink3URL: https://lcsc.com/product-detail/Multilayer-Ceramic-Capacitors-MLCC---SMD-SMT_YAGEO-YAGEO-CC0603JRX7R7BB224_C519556.html
footprint CAP-0603 (0603 (1608M) Capacitor)
pins: 1, 2

## CC0603JRX7R7BB273
designator C?  Capacitance: 27nF  (hidden comment: *)
Capacitor, Ceramic (MLCC), 27nF, ±5%, 16V, X7R, ±5%, SMD 0603; Manufacturer: YAGEO; Manufacturer Part Number: CC0603JRX7R7BB273; Package Size: 0603; JLCPCB Basic Part: No; JLCPCB Part Number: C519533; Supplier 1: LCSC; Category: Capacitors - MLCC; Supplier Part Number 1: C519533; Tolerance: ±5%; Voltage Rating: 16V; Temperature Coefficient: X7R; RoHS: Yes; ComponentLink1Description: Datasheet; ComponentLink1URL: https://wmsc.lcsc.com/wmsc/upload/file/pdf/v2/lcsc/2008191833_YAGEO-CC0603JRX7R7BB273_C519533.pdf; ComponentLink2Description: JLCPCB Part URL; ComponentLink2URL: https://jlcpcb.com/partdetail/C519533; ComponentLink3Description: LCSC Part URL; ComponentLink3URL: https://lcsc.com/product-detail/Multilayer-Ceramic-Capacitors-MLCC---SMD-SMT_YAGEO-YAGEO-CC0603JRX7R7BB273_C519533.html
footprint CAP-0603 (0603 (1608M) Capacitor)
pins: 1, 2

## CC0603JRX7R7BB333
designator C?  Capacitance: 33nF  (hidden comment: *)
Capacitor, Ceramic (MLCC), 33nF, ±5%, 16V, X7R, ±5%, SMD 0603; Manufacturer: YAGEO; Manufacturer Part Number: CC0603JRX7R7BB333; Package Size: 0603; JLCPCB Basic Part: No; JLCPCB Part Number: C519534; Supplier 1: LCSC; Category: Capacitors - MLCC; Supplier Part Number 1: C519534; Tolerance: ±5%; Voltage Rating: 16V; Temperature Coefficient: X7R; RoHS: Yes; ComponentLink1Description: Datasheet; ComponentLink1URL: https://wmsc.lcsc.com/wmsc/upload/file/pdf/v2/lcsc/2005181835_YAGEO-CC0603JRX7R7BB333_C519534.pdf; ComponentLink2Description: JLCPCB Part URL; ComponentLink2URL: https://jlcpcb.com/partdetail/C519534; ComponentLink3Description: LCSC Part URL; ComponentLink3URL: https://lcsc.com/product-detail/Multilayer-Ceramic-Capacitors-MLCC---SMD-SMT_YAGEO-YAGEO-CC0603JRX7R7BB333_C519534.html
footprint CAP-0603 (0603 (1608M) Capacitor)
pins: 1, 2

## CC0603JRX7R7BB334
designator C?  Capacitance: 330nF  (hidden comment: *)
Capacitor, Ceramic (MLCC), 330nF, ±5%, 16V, X7R, ±5%, SMD 0603; Manufacturer: YAGEO; Manufacturer Part Number: CC0603JRX7R7BB334; Package Size: 0603; JLCPCB Basic Part: No; JLCPCB Part Number: C519578; Supplier 1: LCSC; Category: Capacitors - MLCC; Supplier Part Number 1: C519578; Tolerance: ±5%; Voltage Rating: 16V; Temperature Coefficient: X7R; RoHS: Yes; ComponentLink1Description: Datasheet; ComponentLink1URL: https://wmsc.lcsc.com/wmsc/upload/file/pdf/v2/lcsc/2005181835_YAGEO-CC0603JRX7R7BB334_C519578.pdf; ComponentLink2Description: JLCPCB Part URL; ComponentLink2URL: https://jlcpcb.com/partdetail/C519578; ComponentLink3Description: LCSC Part URL; ComponentLink3URL: https://lcsc.com/product-detail/Multilayer-Ceramic-Capacitors-MLCC---SMD-SMT_YAGEO-YAGEO-CC0603JRX7R7BB334_C519578.html
footprint CAP-0603 (0603 (1608M) Capacitor)
pins: 1, 2

## CC0603JRX7R7BB393
designator C?  Capacitance: 39nF  (hidden comment: *)
Capacitor, Ceramic (MLCC), 39nF, ±5%, 16V, X7R, ±5%, SMD 0603; Manufacturer: YAGEO; Manufacturer Part Number: CC0603JRX7R7BB393; Package Size: 0603; JLCPCB Basic Part: No; JLCPCB Part Number: C519535; Supplier 1: LCSC; Category: Capacitors - MLCC; Supplier Part Number 1: C519535; Tolerance: ±5%; Voltage Rating: 16V; Temperature Coefficient: X7R; RoHS: Yes; ComponentLink1Description: Datasheet; ComponentLink1URL: https://wmsc.lcsc.com/wmsc/upload/file/pdf/v2/lcsc/2007231533_YAGEO-CC0603JRX7R7BB393_C519535.pdf; ComponentLink2Description: JLCPCB Part URL; ComponentLink2URL: https://jlcpcb.com/partdetail/C519535; ComponentLink3Description: LCSC Part URL; ComponentLink3URL: https://lcsc.com/product-detail/Multilayer-Ceramic-Capacitors-MLCC---SMD-SMT_YAGEO-YAGEO-CC0603JRX7R7BB393_C519535.html
footprint CAP-0603 (0603 (1608M) Capacitor)
pins: 1, 2

## CC0603JRX7R7BB471
designator C?  Capacitance: 470pF  (hidden comment: *)
Capacitor, Ceramic (MLCC), 470pF, ±5%, 16V, X7R, ±5%, SMD 0603; Manufacturer: YAGEO; Manufacturer Part Number: CC0603JRX7R7BB471; Package Size: 0603; JLCPCB Basic Part: No; JLCPCB Part Number: C519512; Supplier 1: LCSC; Category: Capacitors - MLCC; Supplier Part Number 1: C519512; Tolerance: ±5%; Voltage Rating: 16V; Temperature Coefficient: X7R; RoHS: Yes; ComponentLink1Description: Datasheet; ComponentLink1URL: https://wmsc.lcsc.com/wmsc/upload/file/pdf/v2/lcsc/2008031233_YAGEO-CC0603JRX7R7BB471_C519512.pdf; ComponentLink2Description: JLCPCB Part URL; ComponentLink2URL: https://jlcpcb.com/partdetail/C519512; ComponentLink3Description: LCSC Part URL; ComponentLink3URL: https://lcsc.com/product-detail/Multilayer-Ceramic-Capacitors-MLCC---SMD-SMT_YAGEO-YAGEO-CC0603JRX7R7BB471_C519512.html
footprint CAP-0603 (0603 (1608M) Capacitor)
pins: 1, 2

## CC0603JRX7R7BB473
designator C?  Capacitance: 47nF  (hidden comment: *)
Capacitor, Ceramic (MLCC), 47nF, ±5%, 16V, X7R, ±5%, SMD 0603; Manufacturer: YAGEO; Manufacturer Part Number: CC0603JRX7R7BB473; Package Size: 0603; JLCPCB Basic Part: No; JLCPCB Part Number: C519536; Supplier 1: LCSC; Category: Capacitors - MLCC; Supplier Part Number 1: C519536; Tolerance: ±5%; Voltage Rating: 16V; Temperature Coefficient: X7R; RoHS: Yes; ComponentLink1Description: Datasheet; ComponentLink1URL: https://wmsc.lcsc.com/wmsc/upload/file/pdf/v2/lcsc/2006011835_YAGEO-CC0603JRX7R7BB473_C519536.pdf; ComponentLink2Description: JLCPCB Part URL; ComponentLink2URL: https://jlcpcb.com/partdetail/C519536; ComponentLink3Description: LCSC Part URL; ComponentLink3URL: https://lcsc.com/product-detail/Multilayer-Ceramic-Capacitors-MLCC---SMD-SMT_YAGEO-YAGEO-CC0603JRX7R7BB473_C519536.html
footprint CAP-0603 (0603 (1608M) Capacitor)
pins: 1, 2

## CC0603JRX7R7BB474
designator C?  Capacitance: 470nF  (hidden comment: *)
Capacitor, Ceramic (MLCC), 470nF, ±5%, 16V, X7R, ±5%, SMD 0603; Manufacturer: YAGEO; Manufacturer Part Number: CC0603JRX7R7BB474; Package Size: 0603; JLCPCB Basic Part: No; JLCPCB Part Number: C519558; Supplier 1: LCSC; Category: Capacitors - MLCC; Supplier Part Number 1: C519558; Tolerance: ±5%; Voltage Rating: 16V; Temperature Coefficient: X7R; RoHS: Yes; ComponentLink1Description: Datasheet; ComponentLink1URL: https://wmsc.lcsc.com/wmsc/upload/file/pdf/v2/lcsc/2005181835_YAGEO-CC0603JRX7R7BB474_C519558.pdf; ComponentLink2Description: JLCPCB Part URL; ComponentLink2URL: https://jlcpcb.com/partdetail/C519558; ComponentLink3Description: LCSC Part URL; ComponentLink3URL: https://lcsc.com/product-detail/Multilayer-Ceramic-Capacitors-MLCC---SMD-SMT_YAGEO-YAGEO-CC0603JRX7R7BB474_C519558.html
footprint CAP-0603 (0603 (1608M) Capacitor)
pins: 1, 2

## CC0603JRX7R7BB563
designator C?  Capacitance: 56nF  (hidden comment: *)
Capacitor, Ceramic (MLCC), 56nF, ±5%, 16V, X7R, ±5%, SMD 0603; Manufacturer: YAGEO; Manufacturer Part Number: CC0603JRX7R7BB563; Package Size: 0603; JLCPCB Basic Part: No; JLCPCB Part Number: C519537; Supplier 1: LCSC; Category: Capacitors - MLCC; Supplier Part Number 1: C519537; Tolerance: ±5%; Voltage Rating: 16V; Temperature Coefficient: X7R; RoHS: Yes; ComponentLink1Description: Datasheet; ComponentLink1URL: https://wmsc.lcsc.com/wmsc/upload/file/pdf/v2/lcsc/2008191833_YAGEO-CC0603JRX7R7BB563_C519537.pdf; ComponentLink2Description: JLCPCB Part URL; ComponentLink2URL: https://jlcpcb.com/partdetail/C519537; ComponentLink3Description: LCSC Part URL; ComponentLink3URL: https://lcsc.com/product-detail/Multilayer-Ceramic-Capacitors-MLCC---SMD-SMT_YAGEO-YAGEO-CC0603JRX7R7BB563_C519537.html
footprint CAP-0603 (0603 (1608M) Capacitor)
pins: 1, 2

## CC0603JRX7R7BB683
designator C?  Capacitance: 68nF  (hidden comment: *)
Capacitor, Ceramic (MLCC), 68nF, ±5%, 16V, X7R, ±5%, SMD 0603; Manufacturer: YAGEO; Manufacturer Part Number: CC0603JRX7R7BB683; Package Size: 0603; JLCPCB Basic Part: No; JLCPCB Part Number: C519538; Supplier 1: LCSC; Category: Capacitors - MLCC; Supplier Part Number 1: C519538; Tolerance: ±5%; Voltage Rating: 16V; Temperature Coefficient: X7R; RoHS: Yes; ComponentLink1Description: Datasheet; ComponentLink1URL: https://wmsc.lcsc.com/wmsc/upload/file/pdf/v2/lcsc/2007231533_YAGEO-CC0603JRX7R7BB683_C519538.pdf; ComponentLink2Description: JLCPCB Part URL; ComponentLink2URL: https://jlcpcb.com/partdetail/C519538; ComponentLink3Description: LCSC Part URL; ComponentLink3URL: https://lcsc.com/product-detail/Multilayer-Ceramic-Capacitors-MLCC---SMD-SMT_YAGEO-YAGEO-CC0603JRX7R7BB683_C519538.html
footprint CAP-0603 (0603 (1608M) Capacitor)
pins: 1, 2
